# Altium footprint library Zynq-Video-Board.PcbLib: 39 footprints (part 1 of 3)
Each footprint in its own frame and in the unit in brackets; x right, y up, seen from the top. Pads: shape width x height; smd on the part's side, far side on the other; paste and mask are expansions set on the pad; w line width, h text height; cw(c..) or ccw(c..) is an arc to the next point about the centre after c.
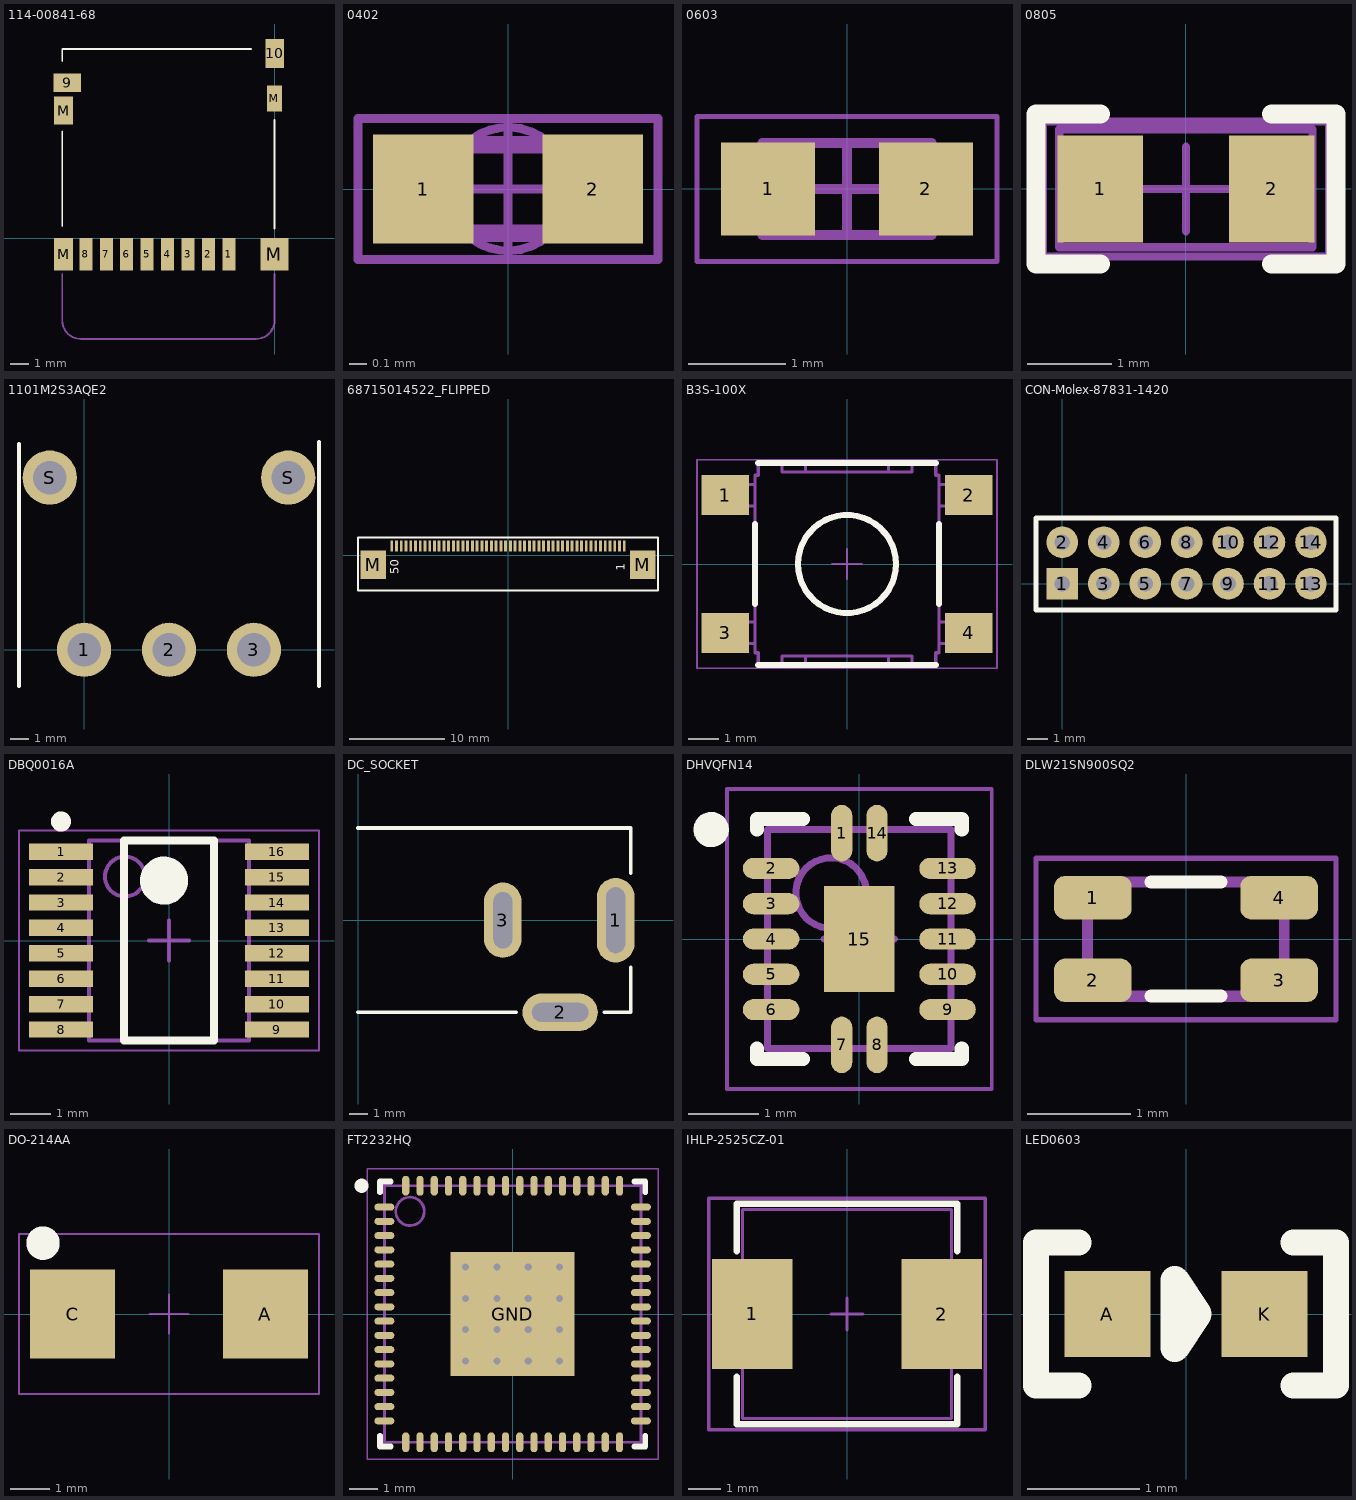
[diagram p0: the footprints below, top view; thin cyan lines are the x and y axes]

## 114-00841-68 [mm]
pads (14):
  rect 0.7x1.75 smd: 1(-2.455,-0.874) 2(-3.555,-0.874) 3(-4.655,-0.874) 4(-5.755,-0.874) 5(-6.855,-0.874) 6(-7.955,-0.874) 7(-9.055,-0.874) 8(-10.155,-0.874)
  rect 1.5x1 smd: 9(-11.155,8.365)
  rect 1x1.55 smd: 10(0.005,9.94)
  rect 1x1.75 smd: M(-11.355,-0.874)
  rect 1x1.5 smd: M(-11.355,6.865)
  rect 1.5x1.75 smd: M(-0.005,-0.874)
  rect 0.8x1.4 smd: M(-0.005,7.515)
Top Overlay:
  lines w0.1: -11.425,0.65 -11.425,5.73 ; -11.425,9.54 -11.425,10.175 -1.265,10.175 ; 0.005,0.523 0.005,6.365
Mechanical 3:
  lines w0.1: -11.425,-1.925 -11.425,-4.425 ccw(c-10.425,-4.425) -10.425,-5.425 -1,-5.425 ccw(c-1,-4.425) 0,-4.425 0,-1.925
  text "Micro SD Card" at -10.15,-4.075 h0.7
3D body: height 1.6, standoff 0, extent -11.628,-1.382 0.372,10.218

## 0402 [mm]
pads (2):
  rect 0.57x0.62 smd: 1(-0.48,0) 2(0.48,0)
Mechanical 3:
  circle w0.05: c0,0 r0.35
  lines w0.05: -0.5,0 0.5,0 ; 0,-0.4 0,0.4 ; -0.85,-0.4 0.85,-0.4 0.85,0.4 -0.85,0.4 -0.85,-0.4
Mechanical 13:
  lines w0.1: -0.5,-0.25 0.5,-0.25 0.5,0.25 -0.5,0.25 -0.5,-0.25
3D body: height 0.35, standoff 0, extent -0.472,-0.25 0.528,0.25

## 0603 [mm]
pads (2):
  rect 0.97x0.96 smd: 1(-0.815,0) 2(0.815,0)
Mechanical 13:
  lines w0.1: -0.875,-0.475 -0.875,0.475 0.875,0.475 0.875,-0.475 -0.875,-0.475
Mechanical 15:
  lines w0.05: -1.55,-0.75 -1.55,0.75 1.55,0.75 1.55,-0.75 -1.55,-0.75
  lines w0.1: -0.475,0 0.475,0 ; 0,-0.475 0,0.475
3D body: height 0.6, standoff 0, extent -0.475,-0.475 0.475,0.475
3D body: height 0.6, standoff 0, extent -0.875,-0.475 -0.475,0.475
3D body: height 0.6, standoff 0, extent 0.475,-0.475 0.875,0.475

## 0805 [mil]
pads (2):
  rect 40x50 smd: 1(-40,0) 2(40,0)
Top Overlay:
  lines w9: -40,-35 -70,-35 -70,35 -40,35 ; 40,-35 70,-35 70,35 40,35
Mechanical 13:
  lines w3.94: -59.09,-27.27 -59.09,27.85 59.02,27.85 59.02,-27.27 -59.09,-27.27
Mechanical 15:
  lines w3.94: -19.68,0 19.68,0 ; 0,-19.68 0,19.68 ; -66.93,-31.5 -66.93,31.5 66.93,31.5 66.93,-31.5 -66.93,-31.5
3D body: height 36.61, standoff -0.39, extent -59.09,-27.27 59.02,27.85

## 1101M2S3AQE2 [mm]
pads (5):
  round 3 hole 1.85: 1(0,0) 2(4.7,0) 3(9.4,0) S(-1.9,9.53) S(11.3,9.53)
Top Overlay:
  lines w0.2: -3.6,-2 -3.6,11.4 ; 13,-2 13,11.5
3D body: height 6.85, standoff -3.08, extent -2.082,-0.642 11.482,15.132

## 68715014522_FLIPPED [mm]
pads (52):
  rect 0.3x1.2 smd: 1(12.25,0.99) 2(11.75,0.99) 3(11.25,0.99) 4(10.75,0.99) 5(10.25,0.99) 6(9.75,0.99) 7(9.25,0.99) 8(8.75,0.99) 9(8.25,0.99) 10(7.75,0.99) 11(7.25,0.99) 12(6.75,0.99) 13(6.25,0.99) 14(5.75,0.99) 15(5.25,0.99) 16(4.75,0.99) 17(4.25,0.99) 18(3.75,0.99) 19(3.25,0.99) 20(2.75,0.99) 21(2.25,0.99) 22(1.75,0.99) 23(1.25,0.99) 24(0.75,0.99) 25(0.25,0.99) 26(-0.25,0.99) 27(-0.75,0.99) 28(-1.25,0.99) 29(-1.75,0.99) 30(-2.25,0.99) 31(-2.75,0.99) 32(-3.25,0.99) 33(-3.75,0.99) 34(-4.25,0.99) 35(-4.75,0.99) 36(-5.25,0.99) 37(-5.75,0.99) 38(-6.25,0.99) 39(-6.75,0.99) 40(-7.25,0.99) 41(-7.75,0.99) 42(-8.25,0.99) 43(-8.75,0.99) 44(-9.25,0.99) 45(-9.75,0.99) 46(-10.25,0.99) 47(-10.75,0.99) 48(-11.25,0.99) 49(-11.75,0.99) 50(-12.25,0.99)
  rect 2.7x3 smd: M(-14.18,-0.99) M(14.18,-0.99)
Top Overlay:
  lines w0.2: -15.8,-3.71 15.8,-3.71 15.8,1.89 -15.8,1.89 -15.8,-3.71
  text "50" at -11.5,-2 h0.9
  text "1" at 12.3,-1.6 h0.9
3D body: height 2.06, standoff -0.04, extent -15.7,-3.71 15.7,1.39

## B3S-100X [mm]
pads (4):
  rect 1.55x1.3 smd: 1(-3.975,2.25) 2(3.975,2.25) 3(-3.975,-2.25) 4(3.975,-2.25)
Top Overlay:
  circle w0.2: c0,0 r1.6
  lines w0.2: -3,-1.3 -3,1.3 ; -2.9,-3.3 2.9,-3.3 ; -2.9,3.3 2.9,3.3 ; 3,-1.3 3,1.3
Mechanical 13:
  circle w0.1: c0,0 r1.65
  lines w0.1: -3.5,-2.6 -3.5,-1.9 ; -3.5,1.9 -3.5,2.6 ; -3,-2.6 -4,-2.6 -4,-1.9 -3,-1.9 ; -3,1.9 -4,1.9 -4,2.6 -3,2.6 ; -2.125,-3.3 -2.125,-3 2.125,-3 2.125,-3.3 ; -2.125,3.3 -2.125,3 2.125,3 2.125,3.3 ; -1.35,-3 -1.35,-3.3 -2.9,-3.3 -2.9,-2.9 -3,-2.9 -3,2.9 -2.9,2.9 -2.9,3.3 -1.35,3.3 -1.35,3 ; 1.35,-3 1.35,-3.3 2.9,-3.3 2.9,-2.9 3,-2.9 3,2.9 2.9,2.9 2.9,3.3 1.35,3.3 1.35,3 ; 3,-2.6 4,-2.6 4,-1.9 3,-1.9 ; 3,1.9 4,1.9 4,2.6 3,2.6 ; 3.5,-2.6 3.5,-1.9 ; 3.5,1.9 3.5,2.6
Mechanical 15:
  lines w0.051: -0.5,0 0.5,0 ; 0,-0.5 0,0.5 ; -4.9,-3.4 4.9,-3.4 4.9,3.4 -4.9,3.4 -4.9,-3.4
3D body: height 4.4, standoff 0, extent -4.5,-3.3 4.5,3.3

## CON-Molex-87831-1420 [mil]
pads (14):
  rect 60x60 hole 30: 1(0,0)
  round 60 hole 30: 2(0,78.74) 3(78.74,0) 4(78.74,78.74) 5(157.48,0) 6(157.48,78.74) 7(236.22,0) 8(236.22,78.74) 9(314.96,0) 10(314.96,78.74) 11(393.7,0) 12(393.7,78.74) 13(472.44,0) 14(472.44,78.74)
Top Overlay:
  lines w10: -50,-50 -50,125 520.08,125 520.08,-50 -50,-50
3D body: height 252.45, standoff -97.94, extent -88.76,-86.02 566.76,162.01

## DBQ0016A [mm]
pads (16):
  rect 1.6x0.41 smd: 1(-2.7,2.222) 2(-2.7,1.587) 3(-2.7,0.953) 4(-2.7,0.318) 5(-2.7,-0.318) 6(-2.7,-0.953) 7(-2.7,-1.587) 8(-2.7,-2.222) 9(2.7,-2.222) 10(2.7,-1.587) 11(2.7,-0.953) 12(2.7,-0.318) 13(2.7,0.318) 14(2.7,0.953) 15(2.7,1.587) 16(2.7,2.222)
Top Overlay:
  circle w0.25: c-2.7,2.977 r0.125
  circle w0.6: c-0.125,1.5 r0.3
  lines w0.2: -1.125,-2.5 -1.125,2.5 1.125,2.5 1.125,-2.5 -1.125,-2.5
Mechanical 13:
  circle w0.1: c-1.1,1.6 r0.5
  lines w0.1: -2,-2.5 -2,2.5 2,2.5 2,-2.5 -2,-2.5
Mechanical 15:
  lines w0.05: -3.75,-2.75 -3.75,2.75 3.75,2.75 3.75,-2.75 -3.75,-2.75
  lines w0.1: -0.5,0 0.5,0 ; 0,-0.5 0,0.5
3D body: height 1.75, standoff 0.1, extent -2,-2.5 2,2.5

## DC_SOCKET [mm]
pads (3):
  oval 2x4.5 hole 1 slot 3.5 at 90 deg: 1(13.7,0)
  oval 4x2 hole 1 slot 3 at 0 deg: 2(10.75,-4.9)
  oval 2x4 hole 1 slot 3 at 90 deg: 3(7.7,0)
Top Overlay:
  lines w0.2: 0,-4.9 8.4,-4.9 ; 0,4.9 14.5,4.9 14.5,2.5 ; 13.1,-4.9 14.5,-4.9 14.5,-2.5
3D body: height 11.01, standoff -3.49, extent 0,-5.1 14.1,4.5

## DHVQFN14 [mm]
pads (15):
  oval 0.3x0.8 smd: 1(-0.25,1.5) 7(-0.25,-1.5) 8(0.25,-1.5) 14(0.25,1.5)
  oval 0.8x0.3 smd: 2(-1.25,1) 3(-1.25,0.5) 4(-1.25,0) 5(-1.25,-0.5) 6(-1.25,-1) 9(1.25,-1) 10(1.25,-0.5) 11(1.25,0) 12(1.25,0.5) 13(1.25,1)
  rect 1x1.5 smd: 15(0,0)
Top Overlay:
  circle w0.25: c-2.1,1.55 r0.125
  lines w0.2: -1.45,-1.55 -1.45,-1.7 -0.8,-1.7 ; -1.45,1.55 -1.45,1.7 -0.8,1.7 ; 0.8,-1.7 1.45,-1.7 1.45,-1.55 ; 0.8,1.7 1.45,1.7 1.45,1.55
Mechanical 13:
  circle w0.1: c-0.4,0.65 r0.5
  lines w0.1: -1.3,-1.55 1.3,-1.55 1.3,1.55 -1.3,1.55 -1.3,-1.55
Mechanical 15:
  lines w0.05: -1.875,-2.125 1.875,-2.125 1.875,2.125 -1.875,2.125 -1.875,-2.125
  lines w0.1: -0.5,0 0.5,0 ; 0,-0.5 0,0.5
3D body: height 0.85, standoff -0.02, extent -1.252,-1.501 1.25,1.501

## DLW21SN900SQ2 [mm]
pads (4):
  rrect50% 0.75x0.42 smd: 1(-0.9,0.4) 2(-0.9,-0.4) 3(0.9,-0.4) 4(0.9,0.4)
Top Overlay:
  lines w0.127: -0.34,-0.55 0.34,-0.55 ; -0.34,0.55 0.34,0.55
Mechanical 2:
  lines w0.001: -1,-0.6 1,-0.6 1,0.6 -1,0.6 -1,-0.6
Mechanical 3:
  lines w0.05: -1.45,-0.78 1.45,-0.78 1.45,0.78 -1.45,0.78 -1.45,-0.78
  lines w0.1: -0.95,-0.55 0.95,-0.55 0.95,0.55 -0.95,0.55 -0.95,-0.55
3D body: height 1.44, standoff 0.24, extent -1,-0.6 1,0.6

## DO-214AA [mm]
pads (2):
  rect 2.16x2.26 smd: A(2.45,0) C(-2.45,0)
Top Overlay:
  circle w0.5: c-3.2,1.8 r0.175
Mechanical 15:
  lines w0.051: -0.5,0 0.5,0 ; 0,-0.5 0,0.5 ; -3.81,-2.032 3.81,-2.032 3.81,2.032 -3.81,2.032 -3.81,-2.032
3D body: height 2.45, standoff 0.03, extent -2.75,-1.95 2.75,1.95

## FT2232HQ [mm]
pads (65):
  oval 0.7x0.25 smd: 2(-4.5,3.25) 3(-4.5,2.75) 4(-4.5,2.25) 6(-4.5,1.25) 7(-4.5,0.75) 8(-4.5,0.25) 9(-4.5,-0.25) 10(-4.5,-0.75) 13(-4.5,-2.25) 14(-4.5,-2.75) 16(-4.5,-3.75) 33(4.5,-3.75) 34(4.5,-3.25) 36(4.5,-2.25) 38(4.5,-1.25) 39(4.5,-0.75) 40(4.5,-0.25) 41(4.5,0.25) 43(4.5,1.25) 44(4.5,1.75) 45(4.5,2.25) 46(4.5,2.75) 48(4.5,3.75) GND(-4.5,-3.25) GND(-4.5,-1.25) GND(-4.5,1.75) GND(-4.5,3.75) GND(4.5,-2.75) GND(4.5,3.25) VCCIO(4.5,0.75) VCORE(-4.5,-1.75) VCORE(4.5,-1.75)
  oval 0.25x0.7 smd: 17(-3.75,-4.5) 18(-3.25,-4.5) 19(-2.75,-4.5) 21(-1.75,-4.5) 22(-1.25,-4.5) 23(-0.75,-4.5) 24(-0.25,-4.5) 26(0.75,-4.5) 27(1.25,-4.5) 28(1.75,-4.5) 29(2.25,-4.5) 30(2.75,-4.5) 32(3.75,-4.5) 49(3.75,4.5) 50(3.25,4.5) 52(2.25,4.5) 53(1.75,4.5) 54(1.25,4.5) 55(0.75,4.5) 57(-0.25,4.5) 58(-0.75,4.5) 59(-1.25,4.5) 60(-1.75,4.5) 61(-2.25,4.5) 62(-2.75,4.5) 63(-3.25,4.5) GND(0.25,-4.5) GND(2.75,4.5) VCCIO(-2.25,-4.5) VCCIO(0.25,4.5) VCCIO(3.25,-4.5) VCORE(-3.75,4.5)
  rect 4.35x4.35 smd: GND(0,0)
via 1.65,-1.65 diameter 0.6 hole 0.25
via 0.55,-1.65 diameter 0.6 hole 0.25
via -0.55,-1.65 diameter 0.6 hole 0.25
via -1.65,-1.65 diameter 0.6 hole 0.25
via 1.65,-0.55 diameter 0.6 hole 0.25
via 0.55,-0.55 diameter 0.6 hole 0.25
via -0.55,-0.55 diameter 0.6 hole 0.25
via -1.65,-0.55 diameter 0.6 hole 0.25
via 1.65,0.55 diameter 0.6 hole 0.25
via 0.55,0.55 diameter 0.6 hole 0.25
via -0.55,0.55 diameter 0.6 hole 0.25
via -1.65,0.55 diameter 0.6 hole 0.25
via 1.65,1.65 diameter 0.6 hole 0.25
via 0.55,1.65 diameter 0.6 hole 0.25
via -0.55,1.65 diameter 0.6 hole 0.25
via -1.65,1.65 diameter 0.6 hole 0.25
Top Overlay:
  circle w0.25: c-5.3,4.5 r0.125
  lines w0.2: -4.65,-4.275 -4.65,-4.65 -4.275,-4.65 ; -4.65,4.275 -4.65,4.65 -4.275,4.65 ; 4.275,-4.65 4.65,-4.65 4.65,-4.275 ; 4.275,4.65 4.65,4.65 4.65,4.275
Mechanical 13:
  circle w0.1: c-3.6,3.6 r0.5
  lines w0.1: -4.5,-4.5 4.5,-4.5 4.5,4.5 -4.5,4.5 -4.5,-4.5
Mechanical 15:
  lines w0.05: -5.1,-5.1 5.1,-5.1 5.1,5.1 -5.1,5.1 -5.1,-5.1
  lines w0.1: -0.5,0 0.5,0 ; 0,-0.5 0,0.5
3D body: height 0.9, standoff 0, extent -4.49,-4.53 4.55,4.51

## IHLP-2525CZ-01 [mm]
pads (2):
  rect 2.5x3.43 smd: 1(-2.95,0) 2(2.95,0)
Top Overlay:
  lines w0.2: -3.43,-1.95 -3.43,-3.43 3.43,-3.43 3.43,-1.95 ; -3.43,1.95 -3.43,3.43 3.43,3.43 3.43,1.95
Mechanical 13:
  lines w0.1: -3.25,-1.6 -3.4,-1.6 -3.4,1.6 -3.25,1.6 ; 3.25,-1.6 3.4,-1.6 3.4,1.6 3.25,1.6 ; -3.25,-3.25 3.25,-3.25 3.25,3.25 -3.25,3.25 -3.25,-3.25
Mechanical 15:
  lines w0.1: -0.5,0 0.5,0 ; 0,-0.5 0,0.5 ; -4.3,-3.6 -4.3,3.6 4.3,3.6 4.3,1.6 4.3,-3.6 -4.3,-3.6
3D body: height 2.9, standoff 0.01, extent -3.525,-3.335 3.551,3.335

## LED0603 [mil]
pads (2):
  rect 30x30 smd: A(-27.5,0) K(27.5,0)
Top Overlay:
  lines w9: -37.5,-25 -52.5,-25 -52.5,25 -37.5,25 ; 37.5,-25 52.5,-25 52.5,25 37.5,25
  lines w10: -3.88,-11.81 4,0 -3.88,11.81 -3.88,-11.81
3D body: height 43.31, standoff 0, extent -32.82,-15.75 30.97,15.75